# Altium footprint library devkit-visao.PcbLib: 48 footprints (part 1 of 3)
Each footprint in its own frame and in the unit in brackets; x right, y up, seen from the top. Pads: shape width x height; smd on the part's side, far side on the other; paste and mask are expansions set on the pad; w line width, h text height; cw(c..) or ccw(c..) is an arc to the next point about the centre after c.
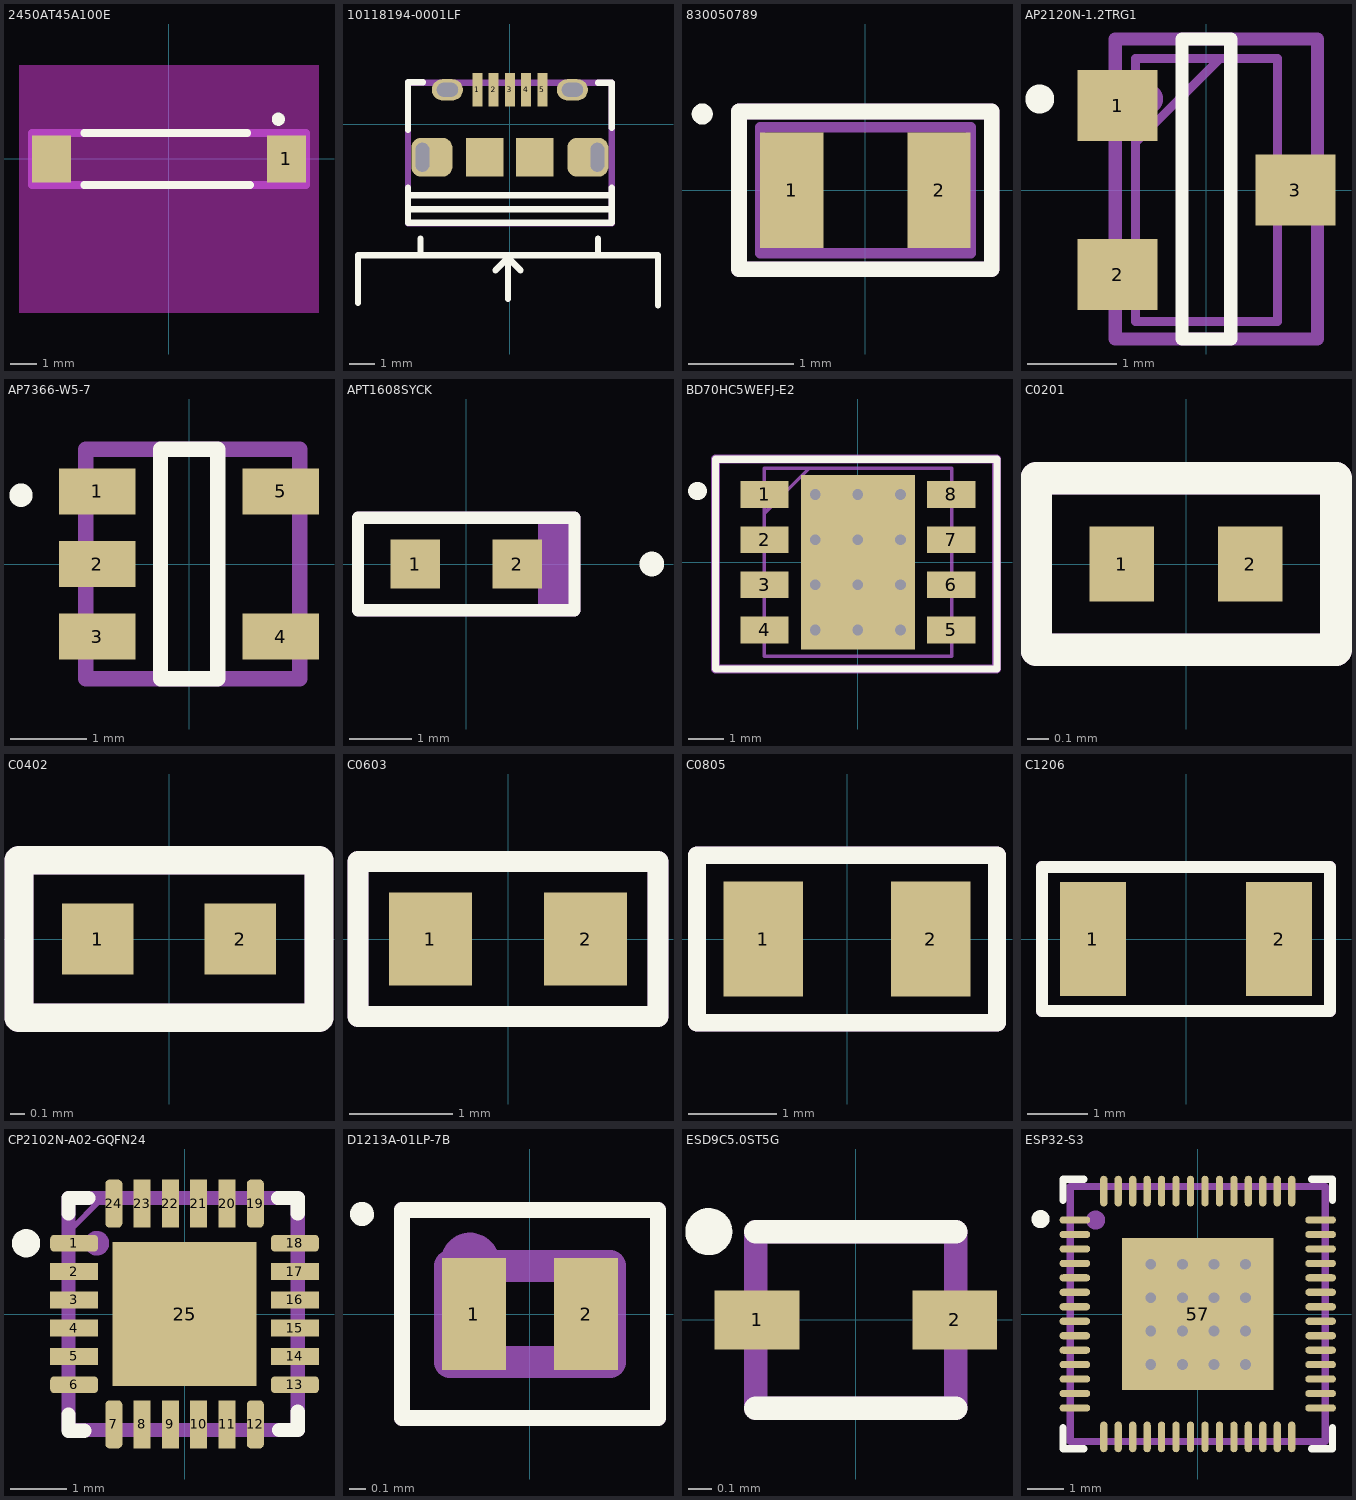
[diagram p0: the footprints below, top view; thin cyan lines are the x and y axes]

## 2450AT45A100E [mm]
pads (2):
  rect 1.5x1.8 smd: 1(4.5,0) ""(-4.5,0)
Top Overlay:
  circle w0.3: c4.191,1.524 r0.1
  lines w0.3: -3.25,-1 3.1,-1 ; -3.25,1 3,1
Keep-Out Layer:
  region: 5.75,-5.9 5.75,3.6 -5.75,3.6 -5.75,-5.9
Mechanical 29:
  circle w0.4: c4.699,0.381 r0.1
  lines w0.3: -5.25,-1 -5.25,1 5.25,1 5.25,-1 -5.25,-1
  text "'.Designator'" at -4.75,-0.425 h0.85
3D body "2450AT45A100.step": height 1.22, standoff 0.01, extent -4.75,-1.016 4.75,0.984

## 10118194-0001LF [mm] "10118194-0001LF"
pads (11):
  rect 0.4x1.35 smd mask+0.05: 1(-1.299,1.369) 2(-0.649,1.369) 3(0.001,1.369) 4(0.651,1.369) 5(1.301,1.369)
  rrect50% 1.645x1.55 hole 0.55 slot 1.15 at 90 deg copper offset 0.38,0: ""(-3.5,-1.331)
  oval 1.25x0.85 hole 0.55 slot 0.85 at 0 deg: ""(-2.499,1.369) ""(2.501,1.369)
  rect 1.5x1.55 smd: ""(-0.999,-1.331) ""(1.001,-1.331)
  rrect50% 1.645x1.55 hole 0.55 slot 1.15 at 90 deg copper offset -0.38,0: ""(3.5,-1.331)
Top Overlay:
  lines w0.254: -6.075,-7.143 -6.075,-5.943 -6.075,-5.243 5.025,-5.243 5.925,-5.243 5.925,-6.043 5.925,-7.243 ; -4.075,-2.556 -4.075,-3.956 4.075,-3.956 4.075,-2.556 ; -4.075,-0.231 -4.075,1.669 ; -3.975,-3.406 4.075,-3.406 ; -3.975,-2.856 4.075,-2.856 ; -3.575,-5.243 -3.575,-4.743 -3.575,-4.593 ; -3.475,1.669 -4.075,1.669 ; -0.575,-5.843 -0.075,-5.343 ; -0.075,-6.993 -0.075,-5.243 ; -0.075,-5.443 -0.075,-5.293 ; 0.425,-5.843 -0.075,-5.343 ; 3.525,-5.243 3.525,-4.743 3.525,-4.593 ; 3.525,1.644 4.075,1.644 4.075,-0.156 ; -4.075,1.669 -4.075,1.669 ; -0.075,-5.343 -0.075,-5.243 ; -0.075,-5.343 -0.075,-5.243
Mechanical 29:
  lines w0.254: -4.075,-3.981 -4.075,1.644 4.075,1.644 4.075,-3.981 -4.075,-3.981
  text "'.Designator'" at -5.867,-1.439 h1
3D body "10118194c.stp": height 3.12, standoff -0.15, extent -4.025,-3.971 4.025,1.609

## 830050789 [mm]
pads (2):
  rect 0.6x1.1 smd: 1(-0.7,0) 2(0.7,0)
Top Overlay:
  lines w0.1: -1.6,0.725 cw(c-1.55,0.725) -1.5,0.725 cw(c-1.55,0.725) -1.6,0.725
  lines w0.15: -1.2,-0.75 1.2,-0.75 1.2,0.75 -1.2,0.75 -1.2,-0.75
Mechanical 13:
  lines w0.1: -1,-0.6 1,-0.6 ; -1,-0.6 -1,0.6 ; -1,-0.6 1,-0.6 ; -1,-0.6 -1,0.6 ; -1,-0.6 1,-0.6 ; -1,-0.6 -1,0.6 ; -1,-0.6 1,-0.6 ; -1,-0.6 -1,0.6 ; -1,0.6 1,0.6 ; -1,0.6 1,0.6 ; -1,0.6 1,0.6 ; -1,0.6 1,0.6 ; 1,-0.6 1,0.6 ; 1,-0.6 1,0.6 ; 1,-0.6 1,0.6 ; 1,-0.6 1,0.6
Mechanical 29:
  circle w0.254: c-0.675,0.325 r0.035
  lines w0.15: -1.2,-0.75 -1.2,0.75 1.2,0.75 1.2,-0.75 -1.2,-0.75
  text "'.Designator'" at -2.25,-0.258 h0.5
3D body "830050789.stp": height 0.7, standoff 0, extent -1,-0.6 1,0.6

## AP2120N-1.2TRG1 [mm]
pads (3):
  rect 0.9x0.8 smd: 1(-1,0.95) 2(-1,-0.95) 3(1,0)
Top Overlay:
  circle w0.254: c-1.875,1.025 r0.035
  lines w0.15: -0.275,-1.675 -0.275,1.7 0.275,1.7 0.275,-1.675 -0.275,-1.675
Mechanical 13:
  lines w0.1: -0.8,0.53 0.15,1.48 ; -0.8,-1.48 -0.8,1.48 0.8,1.48 0.8,-1.48 -0.8,-1.48
Mechanical 29:
  circle w0.254: c-0.65,1.025 r0.035
  lines w0.15: -1.025,-1.675 1.25,-1.675 1.25,1.7 -1.025,1.7 -1.025,-1.675
  text "'.Designator'" at -0.9,-0.083 h0.5
3D body "AP2138N-1.8TRG1.stp": height 1.3, standoff 0, extent -1.412,-1.48 1.413,1.48

## AP7366-W5-7 [mm]
pads (5):
  rect 1x0.6 smd: 1(-1.2,0.95) 2(-1.2,0) 3(-1.2,-0.95) 4(1.2,-0.95) 5(1.2,0.95)
Top Overlay:
  circle w0.254: c-2.2,0.9 r0.025
  lines w0.2: -0.375,-1.5 -0.375,1.5 0.375,1.5 0.375,-1.5 -0.375,-1.5
Mechanical 29:
  circle w0.254: c-0.95,0.95 r0.025
  lines w0.2: -1.35,-1.5 -1.35,1.5 1.45,1.5 1.45,-1.5 -1.35,-1.5
  text "'.Designator'" at -0.918,-0.076 h0.5
3D body "AP7366-W5-7.stp": height 1.4, standoff 0, extent -1.425,-1.5 1.425,1.5

## APT1608SYCK [mm]
pads (2):
  rect 0.8x0.8 smd: 1(-0.825,0) 2(0.825,0)
Top Overlay:
  circle w0.2: c3,0 r0.1
  lines w0.2: -1.75,-0.75 1.75,-0.75 1.75,0.75 1.213,0.75 -0.762,0.75 -1.75,0.75 -1.75,-0.75
Mechanical 29:
  rectangle: 1.163,-0.75 1.75,0.75
  lines w0.2: -1.75,-0.75 -1.75,0.75 1.75,0.75 1.75,0.375 1.75,-0.375 1.75,-0.75 -1.75,-0.75
  text "'.Designator'" at -1.5,-0.75 h0.8
3D body "LED_APT1608_KNB.step": height 0.76, standoff 0, extent -0.8,-0.409 0.8,0.409

## BD70HC5WEFJ-E2 [mm]
pads (9):
  rect 1.35x0.75 smd: 1(-2.625,1.905) 2(-2.625,0.635) 3(-2.625,-0.635) 4(-2.625,-1.905) 5(2.625,-1.905) 6(2.625,-0.635) 7(2.625,0.635) 8(2.625,1.905)
  rect 3.2x4.9 smd paste-2 mask+0.102: ""(0,0)
via -1.2,1.905 diameter 0.6 hole 0.3
via 0,1.905 diameter 0.6 hole 0.3
via 1.2,1.905 diameter 0.6 hole 0.3
via -1.2,0.635 diameter 0.6 hole 0.3
via 0,0.635 diameter 0.6 hole 0.3
via 1.2,0.635 diameter 0.6 hole 0.3
via -1.2,-0.635 diameter 0.6 hole 0.3
via 0,-0.635 diameter 0.6 hole 0.3
via 1.2,-0.635 diameter 0.6 hole 0.3
via -1.2,-1.905 diameter 0.6 hole 0.3
via 0,-1.905 diameter 0.6 hole 0.3
via 1.2,-1.905 diameter 0.6 hole 0.3
Top Overlay:
  lines w0.2: -4,-3 3.912,-3 3.912,2.896 -4,2.896 -4,-3
  lines w0.5: -4.525,2 -4.5,2
Top Paste:
  rectangle: 0.1,-2.4 1.5,-0.975
  rectangle: -1.5,-2.4 -0.1,-0.975
  rectangle: -1.5,1 -0.1,2.4
  rectangle: -1.5,-0.725 -0.1,0.775
  rectangle: 0.1,-0.725 1.5,0.775
  rectangle: 0.1,1 1.5,2.4
Mechanical 13:
  lines w0.1: -2.64,1.37 -1.37,2.64 ; -2.64,-2.64 2.64,-2.64 2.64,2.64 -2.64,2.64 -2.64,-2.64
Mechanical 29:
  circle w0.254: c-2.85,1.9 r0.125
  lines w0.254: -4,-3 3.9,-3 3.9,2.9 -4,2.9 -4,-3
  lines w0.5: -2.875,1.9 -2.85,1.9
  text "'.Designator'" at -1.75,-0.25 h0.8
3D body "HTSOP-J8_ROM.step": height 0.99, standoff 0, extent -2.997,-2.629 2.997,2.629

## C0201 [mm]
pads (2):
  rect 0.3x0.35 smd mask+0.06: 1(-0.3,0) 2(0.3,0)
Top Overlay:
  lines w0.15: -0.7,-0.4 -0.7,0.4 0.7,0.4 0.7,-0.4 -0.7,-0.4
Mechanical 29:
  lines w0.15: -0.7,-0.4 0.7,-0.4 0.7,0.4 -0.7,0.4 -0.7,-0.4
  text "'.Designator'" at -0.4,-0.1 h0.2
3D body "C0201.step": height 0.3, standoff 0, extent -0.3,-0.15 0.3,0.15

## C0402 [mm]
pads (2):
  rect 0.5x0.5 smd: 1(-0.5,0) 2(0.5,0)
Top Overlay:
  lines w0.2: -1.05,-0.55 1.05,-0.55 1.05,0.55 -1.05,0.55 -1.05,-0.55
Mechanical 29:
  lines w0.2: -1.05,-0.55 -1.05,0.55 1.05,0.55 1.05,-0.55 -1.05,-0.55
  text "'.Designator'" at -0.5,-0.25 h0.5
3D body "C0402.step": height 0.51, standoff 0.01, extent -0.5,-0.25 0.5,0.25

## C0603 [mm]
pads (2):
  rect 0.8x0.9 smd: 1(-0.75,0) 2(0.75,0)
Top Overlay:
  lines w0.2: -1.45,-0.75 -1.45,0.75 1.45,0.75 1.45,-0.75 -1.45,-0.75
Mechanical 29:
  lines w0.2: -1.45,-0.75 -1.45,0.75 1.45,0.75 1.45,-0.75 -1.45,-0.75
  text "'.Designator'" at -0.7,-0.3 h0.6
3D body "C0603.step": height 0.81, standoff 0.01, extent -0.8,-0.43 0.8,0.43

## C0805 [mm]
pads (2):
  rect 0.9x1.3 smd: 1(-0.95,0) 2(0.95,0)
Top Overlay:
  lines w0.2: -1.7,-0.95 -1.7,0.95 1.7,0.95 1.7,-0.95 -1.7,-0.95
Mechanical 29:
  lines w0.2: -1.7,-0.95 1.7,-0.95 1.7,0.95 -1.7,0.95 -1.7,-0.95
  text "'.Designator'" at -1.2,-0.4 h0.85
3D body "C0805.step": height 1, standoff 0, extent -1,-0.625 1,0.625

## C1206 [mm] "Chip Capacitor, 2-Leads, Body 3.20x1.60mm, IPC Medium Density"
height 0.95
pads (2):
  rect 1.1x1.9 smd: 1(-1.55,0) 2(1.55,0)
Top Overlay:
  lines w0.2: -2.4,-1.2 2.4,-1.2 2.4,1.2 -2.4,1.2 -2.4,-1.2
Mechanical 29:
  lines w0.2: -2.4,-1.2 -2.4,1.2 2.4,1.2 2.4,-1.2 -2.4,-1.2
  text "'.Designator'" at -2.5,-0.5 h1
3D body "C1206.step": height 0.95, standoff 0, extent -1.7,-0.9 1.7,0.9

## CP2102N-A02-GQFN24 [mm]
pads (29):
  rrect50% 0.85x0.3 smd mask+0.053: 1(-1.95,1.25) 6(-1.95,-1.25) 13(1.95,-1.25) 18(1.95,1.25)
  rect 0.85x0.3 smd mask+0.053: 2(-1.95,0.75) 3(-1.95,0.25) 4(-1.95,-0.25) 5(-1.95,-0.75) 14(1.95,-0.75) 15(1.95,-0.25) 17(1.95,0.75)
  rrect50% 0.3x0.85 smd mask+0.053: 7(-1.25,-1.95) 12(1.25,-1.95) 19(1.25,1.95) 24(-1.25,1.95)
  rect 0.3x0.85 smd mask+0.053: 8(-0.75,-1.95) 9(-0.25,-1.95) 10(0.25,-1.95) 11(0.75,-1.95) 20(0.75,1.95) 21(0.25,1.95) 22(-0.25,1.95) 23(-0.75,1.95)
  rect 0.85x0.3 smd paste+0 mask+0.053: 16(1.95,0.25)
  rect 2.55x2.55 smd paste-1.4: 25(0,0)
  rect 1.1x1.1 on Top Paste: ""(-0.625,-0.65) ""(-0.625,0.65) ""(0.625,-0.65) ""(0.625,0.65)
Top Overlay:
  circle w0.25: c-2.8,1.25 r0.125
  lines w0.254: -2.05,-1.775 -2.05,-2.062 -1.775,-2.062 ; -2.05,1.775 -2.05,2.05 -1.7,2.05 ; 1.65,2.05 2,2.05 2,1.775 ; 1.675,-2.05 2,-2.05 2,-1.725
Mechanical 13:
  lines w0.1: -2,1.5 -1.5,2 ; -2,-2 -2,2 2,2 2,-2 -2,-2
Mechanical 29:
  circle w0.254: c-1.55,1.25 r0.09
  lines w0.254: -2.05,-2.025 -2.025,-2.05 2,-2.05 2,2.05 -2.05,2.05 -2.05,-2.025
  text "'.Designator'" at -2.561,-0.24 h0.5
3D body "CP2102N-A02-GQFN24R.stp": height 0.8, standoff 0, extent -2.05,-2.05 2.05,2.05

## D1213A-01LP-7B [mm]
pads (2):
  rect 0.4x0.7 smd: 1(-0.35,0) 2(0.35,0)
Top Overlay:
  lines w0.1: -1.028,0.636 ccw(c-1.05,0.625) -1.025,0.625 ; -0.8,-0.65 0.8,-0.65 0.8,0.65 -0.8,0.65 -0.8,-0.65
Mechanical 13:
  lines w0.2: -0.5,-0.3 -0.5,0.3 0.5,0.3 0.5,-0.3 -0.5,-0.3
Mechanical 29:
  circle w0.254: c-0.375,0.325 r0.056
  lines w0.1: -0.8,-0.65 -0.8,0.65 0.8,0.65 0.8,-0.65 -0.8,-0.65
  text "'.Designator'" at -0.85,-0.275 h0.5
3D body "D1213A-01LP-7B v3.step": height 0.5, standoff 0, extent -0.537,-0.337 0.538,0.337

## ESD9C5.0ST5G [mm]
height 0.4
pads (2):
  rect 0.36x0.25 smd mask+0.051: 1(-0.42,0) 2(0.42,0)
Top Overlay:
  circle w0.1: c-0.625,0.375 r0.05
  lines w0.1: -0.425,-0.375 0.425,-0.375 ; -0.425,0.375 0.425,0.375
Mechanical 29:
  lines w0.1: -0.425,-0.375 0.425,-0.375 0.425,0.375 -0.425,0.375 -0.425,-0.375
  text "'.Designator'" at -0.325,-0.125 h0.3
3D body "ESD9C5.0ST5G.step": height 0.4, standoff 0, extent -0.5,-0.325 0.5,0.325

## ESP32-S3 [mm] "QFN, 56-Leads, Body 7,00x7,00mm, Pitch 0,40mm, Thermal Pad 4,00x4,00mm, IPC Medium Density"
height 0.9
pads (61):
  oval 0.85x0.2 smd mask+0.051: 1(-3.4,2.6) 2(-3.4,2.2) 3(-3.4,1.8) 4(-3.4,1.4) 5(-3.4,1) 6(-3.4,0.6) 7(-3.4,0.2) 8(-3.4,-0.2) 9(-3.4,-0.6) 10(-3.4,-1) 11(-3.4,-1.4) 12(-3.4,-1.8) 13(-3.4,-2.2) 14(-3.4,-2.6) 29(3.4,-2.6) 30(3.4,-2.2) 31(3.4,-1.8) 32(3.4,-1.4) 33(3.4,-1) 34(3.4,-0.6) 35(3.4,-0.2) 36(3.4,0.2) 37(3.4,0.6) 38(3.4,1) 39(3.4,1.4) 40(3.4,1.8) 41(3.4,2.2) 42(3.4,2.6)
  oval 0.2x0.85 smd mask+0.051: 15(-2.6,-3.4) 16(-2.2,-3.4) 17(-1.8,-3.4) 18(-1.4,-3.4) 19(-1,-3.4) 20(-0.6,-3.4) 21(-0.2,-3.4) 22(0.2,-3.4) 23(0.6,-3.4) 24(1,-3.4) 25(1.4,-3.4) 26(1.8,-3.4) 27(2.2,-3.4) 28(2.6,-3.4) 43(2.6,3.4) 44(2.2,3.4) 45(1.8,3.4) 46(1.4,3.4) 47(1,3.4) 48(0.6,3.4) 49(0.2,3.4) 50(-0.2,3.4) 51(-0.6,3.4) 52(-1,3.4) 53(-1.4,3.4) 54(-1.8,3.4) 55(-2.2,3.4) 56(-2.6,3.4)
  rect 4.2x4.2 smd paste-2: 57(0,0)
  rect 1.5x1.5 on Top Paste: ""(-0.999,0.922) ""(-0.975,-0.925) ""(0.976,0.922) ""(1,-0.925)
via -0.425,1.375 diameter 0.6 hole 0.3
via 0.45,-1.4 diameter 0.6 hole 0.3
via 1.325,-1.4 diameter 0.6 hole 0.3
via 1.325,-0.475 diameter 0.6 hole 0.3
via -0.425,-0.475 diameter 0.6 hole 0.3
via 0.45,-0.475 diameter 0.6 hole 0.3
via -0.425,-1.4 diameter 0.6 hole 0.3
via -1.3,-1.4 diameter 0.6 hole 0.3
via -0.425,0.45 diameter 0.6 hole 0.3
via 1.325,1.375 diameter 0.6 hole 0.3
via -1.3,1.375 diameter 0.6 hole 0.3
via 0.45,1.375 diameter 0.6 hole 0.3
via -1.3,-0.475 diameter 0.6 hole 0.3
via 1.325,0.45 diameter 0.6 hole 0.3
via 0.45,0.45 diameter 0.6 hole 0.3
via -1.3,0.45 diameter 0.6 hole 0.3
Top Overlay:
  circle w0.25: c-4.35,2.625 r0.125
  lines w0.2: -3.725,-3.15 -3.725,-3.725 -3.15,-3.725 ; -3.725,3.15 -3.725,3.725 -3.15,3.725 ; 3.15,-3.725 3.725,-3.725 3.725,-3.15 ; 3.15,3.725 3.725,3.725 3.725,3.15
Mechanical 29:
  circle w0.254: c-2.825,2.6 r0.135
  lines w0.2: -3.525,-3.525 3.525,-3.525 3.525,3.525 -3.525,3.525 -3.525,-3.525
  text "'.Designator'" at -5.496,-0.488 h1.52
3D body "ESP32-S3.step": height 0.9, standoff 0, extent -3.526,-3.526 3.526,3.526